# Altium footprint library Library.PcbLib: 292 footprints (part 1 of 20)
Each footprint in its own frame and in the unit in brackets; x right, y up, seen from the top. Pads: shape width x height; smd on the part's side, far side on the other; paste and mask are expansions set on the pad; w line width, h text height; cw(c..) or ccw(c..) is an arc to the next point about the centre after c.
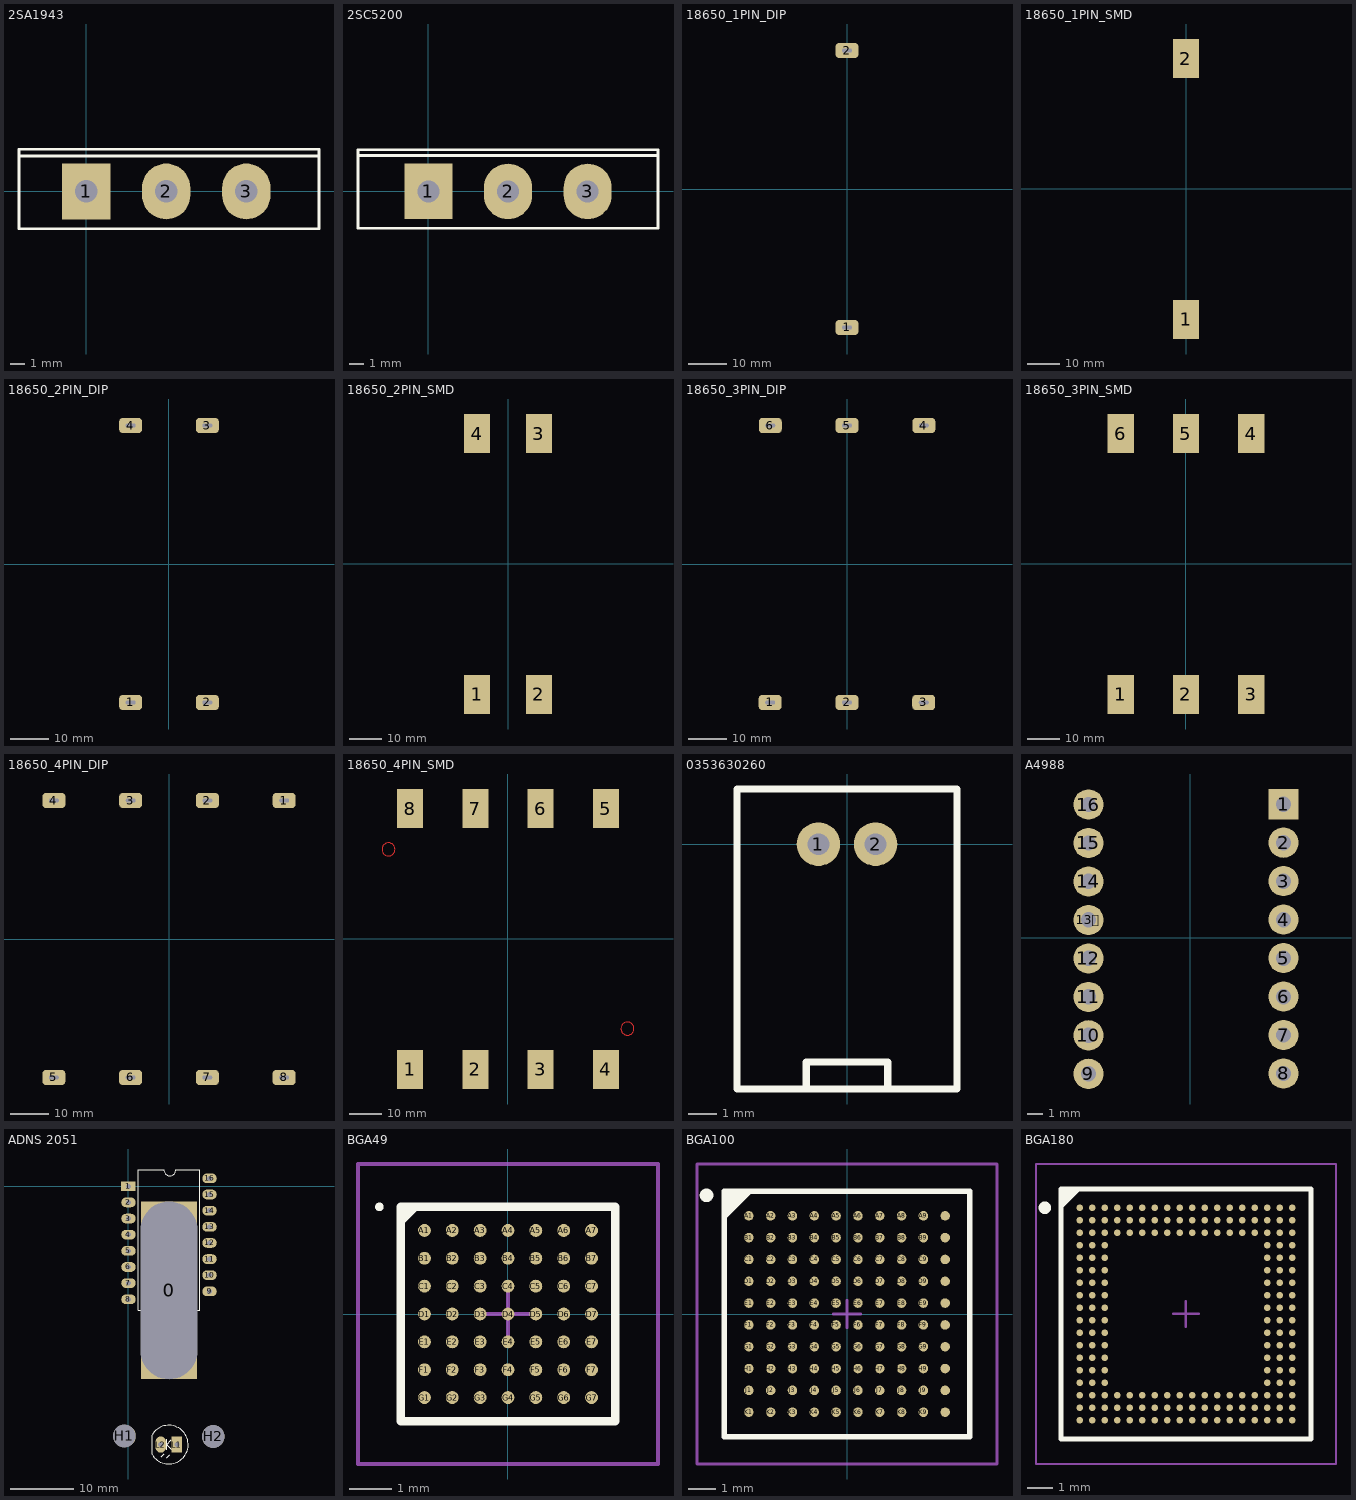
[diagram p0: the footprints below, top view; thin cyan lines are the x and y axes]

## 2SA1943 [mil] "2SA1943"
height 200
pads (3):
  rect 130x150 hole 60: 1(0,0)
  oval 130x150 hole 60: 2(215,0) 3(430,0)
Top Overlay:
  lines w7: -175,95 625,95 ; -180,-100 625,-100 625,113 -180,113 -180,-100
3D body "User Library-2SA1943.step": height 1485.22, standoff -324.98, extent -183.54,-95 623.54,109.72

## 2SC5200 [mil] "2SC5200"
height 200
pads (3):
  rect 130x150 hole 60: 1(0,0)
  oval 130x150 hole 60: 2(215,0) 3(430,0)
Top Overlay:
  lines w7: -190,97 620,97 ; -190,-100 -190,113 620,113 620,-100 -190,-100
3D body "User Library-2SC5200.step": height 1485.22, standoff -324.98, extent -188.54,-94.72 618.54,110

## 18650_1PIN_DIP [mm] "18650 HOLDER"
pads (2):
  rrect50% 6x4 hole 1 slot 2.5 at 0 deg: 1(0,-36.03) 2(0,36.21)
3D body "Hold_18650-1p.stp": height 21.5, standoff -3.99, extent -10,-39 10,39

## 18650_1PIN_SMD [mm] "18650 HOLDER"
pads (2):
  rect 8x12 smd: 1(0,-40.03) 2(0,40.03)
3D body "Hold_18650-1p_smd.stp": height 16, standoff -3.3, extent -10.4,-43.22 10.4,43.22

## 18650_2PIN_DIP [mm] "18650 HOLDER"
pads (4):
  rrect50% 6x4 hole 1 slot 2.5 at 0 deg: 1(-10.007,-36.03) 2(10.007,-36.03) 3(10.007,36.21) 4(-10.007,36.21)
3D body "Hold_18650-2p.stp": height 21.5, standoff -3.99, extent -20,-39 20,39

## 18650_2PIN_SMD [mm] "18650 HOLDER"
pads (4):
  rect 8x12 smd: 1(-9.5,-40.03) 2(9.5,-40.03) 3(9.5,40.03) 4(-9.5,40.03)
3D body "Hold_18650-2p_smd.stp": height 16, standoff -3.3, extent -19.8,-43.22 19.8,43.22

## 18650_3PIN_DIP [mm] "18650 HOLDER"
pads (6):
  rrect50% 6x4 hole 1 slot 2.5 at 0 deg: 1(-20.042,-36.03) 2(0,-36.03) 3(20.013,-36.03) 4(20.042,36.21) 5(0,36.21) 6(-20.013,36.21)
3D body "Hold_18650-3p.stp": height 21.5, standoff -3.99, extent -30,-39 30,39

## 18650_3PIN_SMD [mm] "18650 HOLDER"
pads (6):
  rect 8x12 smd: 1(-20.013,-40.03) 2(0,-40.03) 3(20.042,-40.03) 4(20.042,40.03) 5(0,40.03) 6(-20.013,40.03)
3D body "Hold_18650-3p_smd.stp": height 16, standoff -3.3, extent -30.7,-43.22 30.7,43.22

## 18650_4PIN_DIP [mm] "18650 HOLDER"
pads (8):
  rrect50% 6x4 hole 1 slot 2.5 at 0 deg: 1(30.019,36.21) 2(10.006,36.21) 3(-10.006,36.21) 4(-30.019,36.21) 5(-30.048,-36.03) 6(-10.036,-36.03) 7(9.977,-36.03) 8(29.99,-36.03)
3D body "Hold_18650-4p.stp": height 21.5, standoff -4, extent -40,-39 40,39

## 18650_4PIN_SMD [mm] "18650 HOLDER"
pads (8):
  rect 8x12 smd: 1(-30.019,-40.03) 2(-10.006,-40.03) 3(10.006,-40.03) 4(30.019,-40.03) 5(30.019,40.03) 6(10.006,40.03) 7(-10.006,40.03) 8(-30.019,40.03)
Top Layer:
  circle w0.254: c-36.661,27.506 r2
  circle w0.254: c36.661,-27.506 r2
3D body "Hold_18650-4p_smd.stp": height 16, standoff -3.3, extent -40.4,-43.22 40.4,43.22

## 0353630260 [mil] "CONN HEADER R/A 2POS 2MM"
pads (2):
  round 60 hole 30: 1(-39.37,0) 2(39.37,0)
Top Overlay:
  lines w10: -151.57,-337.32 -151.57,76.06 151.57,76.06 151.57,-337.32 -151.57,-337.32 ; -56.23,-337.32 56.23,-337.32 56.23,-300 -56.23,-300 -56.23,-337.32
3D body "35363-0260.stp": height 218.5, standoff -124.02, extent -151.57,-337.32 151.57,76.06

## A4988 [mm]
pads (16):
  rect 2x2 hole 1.02: 1(6.157,8.806)
  round 2 hole 1.02: 2(6.157,6.266) 3(6.157,3.726) 4(6.157,1.186) 5(6.157,-1.354) 6(6.157,-3.894) 7(6.157,-6.434) 8(6.157,-8.974) 9(-6.719,-8.999) 10(-6.719,-6.459) 11(-6.719,-3.919) 12(-6.719,-1.379) "13 "(-6.719,1.161) 14(-6.719,3.701) 15(-6.719,6.241) 16(-6.719,8.781)
3D body "User Library-A4988.STEP": height -4.18, standoff -14.34, extent -7.884,-10.242 7.356,10.078
3D body "61300811821.stp": height 8.51, standoff -3.09, extent -7.969,-10.519 -5.468,10.301
3D body "61300811821.stp": height 8.51, standoff -3.09, extent 4.906,-10.494 7.406,10.326

## ADNS 2051 [mil] "Foots pin for Mouse"
pads (21):
  rect 350x1100 hole 350 slot 1100 at 90 deg: 0(251,-645)
  rect 90x60 hole 31: 1(0,0)
  oval 90x60 hole 31: 2(0,-100) 3(0,-200) 4(0,-300) 5(0,-400) 6(0,-500) 7(0,-600) 8(0,-700) 9(502,-651) 10(502,-551) 11(502,-451) 12(502,-351) 13(502,-251) 14(502,-151) 15(502,-51) 16(502,49)
  round 140 hole 140: H1(-25,-1547) H2(525,-1550)
  rect 65x100 hole 32: L1(300,-1600.5)
  oval 65x100 hole 32: L2(200,-1600.5)
Top Overlay:
  lines w7: 146,-1660.5 146,-1541.5 ; 146.06,-1540.53 cw(c250,-1600.5) 146.49,-1661.21 ; 204,-1675.5 221,-1658.5 ; 218,103 59,103 59,-767 443,-767 443,103 296,103 ; 218.97,101 ccw(c255.99,101) 293,101 ; 236,-1632.5 236,-1566.5 ; 238,-1681.5 255,-1664.5 ; 265,-1629.5 236,-1600.5 265,-1571.5 ; 394.94,-516.95 ccw(c252.8,-525.96) 395,-518
  text "ADNS2051" at 108,-229 h40

## BGA49 [mm] "BGA, 49-Leads, Body 5x5mm, Pitch 0.65mm"
height 1
pads (49):
  round 0.3 smd: A1(-1.95,1.95) A2(-1.3,1.95) A3(-0.65,1.95) A4(0,1.95) A5(0.65,1.95) A6(1.3,1.95) A7(1.95,1.95) B1(-1.95,1.3) B2(-1.3,1.3) B3(-0.65,1.3) B4(0,1.3) B5(0.65,1.3) B6(1.3,1.3) B7(1.95,1.3) C1(-1.95,0.65) C2(-1.3,0.65) C3(-0.65,0.65) C4(0,0.65) C5(0.65,0.65) C6(1.3,0.65) C7(1.95,0.65) D1(-1.95,0) D2(-1.3,0) D3(-0.65,0) D4(0,0) D5(0.65,0) D6(1.3,0) D7(1.95,0) E1(-1.95,-0.65) E2(-1.3,-0.65) E3(-0.65,-0.65) E4(0,-0.65) E5(0.65,-0.65) E6(1.3,-0.65) E7(1.95,-0.65) F1(-1.95,-1.3) F2(-1.3,-1.3) F3(-0.65,-1.3) F4(0,-1.3) F5(0.65,-1.3) F6(1.3,-1.3) F7(1.95,-1.3) G1(-1.95,-1.95) G2(-1.3,-1.95) G3(-0.65,-1.95) G4(0,-1.95) G5(0.65,-1.95) G6(1.3,-1.95) G7(1.95,-1.95)
Top Overlay:
  circle w0.1: c-3,2.5 r0.05
  region: -2.178,2.5 -2.5,2.178 -2.5,2.5
  lines w0.2: -2.5,2.178 -2.178,2.5 ; -2.5,-2.5 -2.5,2.5 2.5,2.5 2.5,-2.5 -2.5,-2.5
Mechanical 13:
  lines w0.1: -2.5,-2.5 -2.5,2.5 2.5,2.5 2.5,-2.5 -2.5,-2.5
Mechanical 15:
  lines w0.1: -0.5,0 0.5,0 ; 0,-0.5 0,0.5 ; -3.5,-3.5 -3.5,3.5 3.5,3.5 3.5,-3.5 -3.5,-3.5
3D body "User Library-VFBGA-49.step": height 1, standoff 0.03, extent -2.5,-2.5 2.5,2.5

## BGA100 [mm] "BGA, 100-Leads, Body 9x9mm, Pitch 0.8mm"
height 1.2
pads (100):
  round 0.35 smd: A1(-3.6,3.6) A2(-2.8,3.6) A3(-2,3.6) A4(-1.2,3.6) A5(-0.4,3.6) A6(0.4,3.6) A7(1.2,3.6) A8(2,3.6) A9(2.8,3.6) A10(3.6,3.6) B1(-3.6,2.8) B2(-2.8,2.8) B3(-2,2.8) B4(-1.2,2.8) B5(-0.4,2.8) B6(0.4,2.8) B7(1.2,2.8) B8(2,2.8) B9(2.8,2.8) B10(3.6,2.8) C1(-3.6,2) C2(-2.8,2) C3(-2,2) C4(-1.2,2) C5(-0.4,2) C6(0.4,2) C7(1.2,2) C8(2,2) C9(2.8,2) C10(3.6,2) D1(-3.6,1.2) D2(-2.8,1.2) D3(-2,1.2) D4(-1.2,1.2) D5(-0.4,1.2) D6(0.4,1.2) D7(1.2,1.2) D8(2,1.2) D9(2.8,1.2) D10(3.6,1.2) E1(-3.6,0.4) E2(-2.8,0.4) E3(-2,0.4) E4(-1.2,0.4) E5(-0.4,0.4) E6(0.4,0.4) E7(1.2,0.4) E8(2,0.4) E9(2.8,0.4) E10(3.6,0.4) F1(-3.6,-0.4) F2(-2.8,-0.4) F3(-2,-0.4) F4(-1.2,-0.4) F5(-0.4,-0.4) F6(0.4,-0.4) F7(1.2,-0.4) F8(2,-0.4) F9(2.8,-0.4) F10(3.6,-0.4) G1(-3.6,-1.2) G2(-2.8,-1.2) G3(-2,-1.2) G4(-1.2,-1.2) G5(-0.4,-1.2) G6(0.4,-1.2) G7(1.2,-1.2) G8(2,-1.2) G9(2.8,-1.2) G10(3.6,-1.2) H1(-3.6,-2) H2(-2.8,-2) H3(-2,-2) H4(-1.2,-2) H5(-0.4,-2) H6(0.4,-2) H7(1.2,-2) H8(2,-2) H9(2.8,-2) H10(3.6,-2) J1(-3.6,-2.8) J2(-2.8,-2.8) J3(-2,-2.8) J4(-1.2,-2.8) J5(-0.4,-2.8) J6(0.4,-2.8) J7(1.2,-2.8) J8(2,-2.8) J9(2.8,-2.8) J10(3.6,-2.8) K1(-3.6,-3.6) K2(-2.8,-3.6) K3(-2,-3.6) K4(-1.2,-3.6) K5(-0.4,-3.6) K6(0.4,-3.6) K7(1.2,-3.6) K8(2,-3.6) K9(2.8,-3.6) K10(3.6,-3.6)
Top Overlay:
  circle w0.25: c-5.15,4.35 r0.125
  region: -3.584,4.5 -4.5,3.584 -4.5,4.5
  lines w0.2: -4.5,3.584 -3.584,4.5 ; -4.5,-4.5 4.5,-4.5 4.5,4.5 -4.5,4.5 -4.5,-4.5
Mechanical 13:
  lines w0.1: -4.5,-4.5 4.5,-4.5 4.5,4.5 -4.5,4.5 -4.5,-4.5
Mechanical 15:
  lines w0.1: -0.5,0 0.5,0 ; 0,-0.5 0,0.5 ; -5.5,-5.5 5.5,-5.5 5.5,5.5 -5.5,5.5 -5.5,-5.5
3D body "BGA100C80P10X10_900X900X150.step": height 1.5, standoff 0, extent -4.5,-4.5 4.5,4.5

## BGA180 [mm] "BGA, 180-Leads, Body 10x10mm, Pitch 0.5mm"
height 1.11
pads (180):
  round 0.267 smd paste+0.038 mask+0.038: A1(-17,17) A2(-16.5,17) A3(-16,17) A4(-15.5,17) A5(-15,17) A6(-14.5,17) A7(-14,17) A8(-13.5,17) A9(-13,17) A10(-12.5,17) A11(-12,17) A12(-11.5,17) A13(-11,17) A14(-10.5,17) A15(-10,17) A16(-9.5,17) A17(-9,17) A18(-8.5,17) B1(-17,16.5) B2(-16.5,16.5) B3(-16,16.5) B4(-15.5,16.5) B5(-15,16.5) B6(-14.5,16.5) B7(-14,16.5) B8(-13.5,16.5) B9(-13,16.5) B10(-12.5,16.5) B11(-12,16.5) B12(-11.5,16.5) B13(-11,16.5) B14(-10.5,16.5) B15(-10,16.5) B16(-9.5,16.5) B17(-9,16.5) B18(-8.5,16.5) C1(-17,16) C2(-16.5,16) C3(-16,16) C4(-15.5,16) C5(-15,16) C6(-14.5,16) C7(-14,16) C8(-13.5,16) C9(-13,16) C10(-12.5,16) C11(-12,16) C12(-11.5,16) C13(-11,16) C14(-10.5,16) C15(-10,16) C16(-9.5,16) C17(-9,16) C18(-8.5,16) D1(-17,15.5) D2(-16.5,15.5) D3(-16,15.5) D16(-9.5,15.5) D17(-9,15.5) D18(-8.5,15.5) E1(-17,15) E2(-16.5,15) E3(-16,15) E16(-9.5,15) E17(-9,15) E18(-8.5,15) F1(-17,14.5) F2(-16.5,14.5) F3(-16,14.5) F16(-9.5,14.5) F17(-9,14.5) F18(-8.5,14.5) G1(-17,14) G2(-16.5,14) G3(-16,14) G16(-9.5,14) G17(-9,14) G18(-8.5,14) H1(-17,13.5) H2(-16.5,13.5) H3(-16,13.5) H16(-9.5,13.5) H17(-9,13.5) H18(-8.5,13.5) J1(-17,13) J2(-16.5,13) J3(-16,13) J16(-9.5,13) J17(-9,13) J18(-8.5,13) K1(-17,12.5) K2(-16.5,12.5) K3(-16,12.5) K16(-9.5,12.5) K17(-9,12.5) K18(-8.5,12.5) L1(-17,12) L2(-16.5,12) L3(-16,12) L16(-9.5,12) L17(-9,12) L18(-8.5,12) M1(-17,11.5) M2(-16.5,11.5) M3(-16,11.5) M16(-9.5,11.5) M17(-9,11.5) M18(-8.5,11.5) N1(-17,11) N2(-16.5,11) N3(-16,11) N16(-9.5,11) N17(-9,11) N18(-8.5,11) P1(-17,10.5) P2(-16.5,10.5) P3(-16,10.5) P16(-9.5,10.5) P17(-9,10.5) P18(-8.5,10.5) R1(-17,10) R2(-16.5,10) R3(-16,10) R16(-9.5,10) R17(-9,10) R18(-8.5,10) T1(-17,9.5) T2(-16.5,9.5) T3(-16,9.5) T4(-15.5,9.5) T5(-15,9.5) T6(-14.5,9.5) T7(-14,9.5) T8(-13.5,9.5) T9(-13,9.5) T10(-12.5,9.5) T11(-12,9.5) T12(-11.5,9.5) T13(-11,9.5) T14(-10.5,9.5) T15(-10,9.5) T16(-9.5,9.5) T17(-9,9.5) T18(-8.5,9.5) U1(-17,9) U2(-16.5,9) U3(-16,9) U4(-15.5,9) U5(-15,9) U6(-14.5,9) U7(-14,9) U8(-13.5,9) U9(-13,9) U10(-12.5,9) U11(-12,9) U12(-11.5,9) U13(-11,9) U14(-10.5,9) U15(-10,9) U16(-9.5,9) U17(-9,9) U18(-8.5,9) V1(-17,8.5) V2(-16.5,8.5) V3(-16,8.5) V4(-15.5,8.5) V5(-15,8.5) V6(-14.5,8.5) V7(-14,8.5) V8(-13.5,8.5) V9(-13,8.5) V10(-12.5,8.5) V11(-12,8.5) V12(-11.5,8.5) V13(-11,8.5) V14(-10.5,8.5) V15(-10,8.5) V16(-9.5,8.5) V17(-9,8.5) V18(-8.5,8.5)
Top Overlay:
  circle w0.25: c-18.4,17 r0.125
  region: -17.056,17.75 -17.75,17.056 -17.75,17.75
  lines w0.2: -17.75,17.056 -17.056,17.75 ; -17.75,7.75 -17.75,17.75 -7.75,17.75 -7.75,7.75 -17.75,7.75
Mechanical 13:
  lines w0.1: -17.75,7.75 -17.75,17.75 -7.75,17.75 -7.75,7.75 -17.75,7.75
Mechanical 15:
  lines w0.1: -13.25,12.75 -12.25,12.75 ; -12.75,12.25 -12.75,13.25 ; -18.75,6.75 -18.75,18.75 -6.75,18.75 -6.75,6.75 -18.75,6.75
3D body: height 0.51, standoff 0, extent -17.793,7.734 -7.734,17.793